# Altium footprint library HubProModel_v1.PcbLib: 67 footprints (part 5 of 5)
Each footprint in its own frame and in the unit in brackets; x right, y up, seen from the top. Pads: shape width x height; smd on the part's side, far side on the other; paste and mask are expansions set on the pad; w line width, h text height; cw(c..) or ccw(c..) is an arc to the next point about the centre after c.
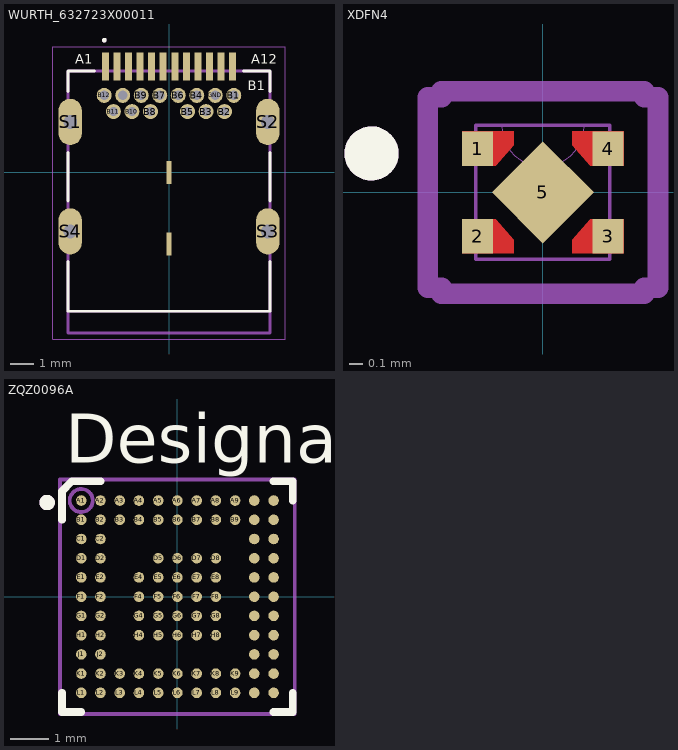
[diagram p4: the footprints below, top view; thin cyan lines are the x and y axes]

## WURTH_632723X00011 [mm] "USB-C (USB TYPE-C) USB 3.2 Gen 2 (USB 3.1 Gen 2, Superspeed + (USB 3.1)) Receptacle Connector 24 Position Surface Mount, Right Angle; Through Hole"
pads (32):
  rect 0.3x1.2 smd: A1(-2.75,4.58) A2(-2.25,4.58) A3(-1.75,4.58) A4(-1.25,4.58) A5(-0.75,4.58) A6(-0.25,4.58) A7(0.25,4.58) A8(0.75,4.58) A9(1.25,4.58) A10(1.75,4.58) A11(2.25,4.58) A12(2.75,4.58)
  round 0.65 hole 0.4: B1(2.8,3.33) B2(2.4,2.63) B3(1.6,2.63) B4(1.2,3.33) B5(0.8,2.63) B6(0.4,3.33) B7(-0.4,3.33) B8(-0.8,2.63) B9(-1.2,3.33) B10(-1.6,2.63) B11(-2.4,2.63) B12(-2.8,3.33) GND(2,3.33) GND1(-2,3.33)
  oval 1x2 hole 0.6 square: S1(-4.27,2.18) S2(4.27,2.18) S3(4.27,-2.55) S4(-4.27,-2.55)
  rect 0.2x1 smd: S5(0,0) S6(0,-3.1)
Top Overlay:
  circle w0.1: c-2.794,5.715 r0.05
  lines w0.127: -4.37,-3.854 -4.37,-6 4.37,-6 4.37,-3.854 ; -4.37,-1.236 -4.37,0.867 ; -4.37,3.494 -4.37,4.38 -3.213,4.38 ; 3.213,4.38 4.37,4.38 4.37,3.494 ; 4.37,-1.236 4.37,0.867
  text "A12" at 3.55,4.7 h0.41
  text "B1" at 3.4,3.55 h0.41
  text "A1" at -4.05,4.7 h0.41
Mechanical 13:
  lines w0.1: -2.748,5.735 ccw(c-2.794,5.715) -2.744,5.715
  lines w0.127: -4.37,-6 4.37,-6 ; -4.37,-6 -4.37,4.38 4.37,4.38 4.37,-6 ; -4.37,-6 -4.37,-6.95 4.37,-6.95 4.37,-6
  text "B1" at 3.4,3.55 h0.41
  text "A12" at 3.55,4.7 h0.41
  text "A1" at -4.05,4.7 h0.41
Mechanical 15:
  lines w0.05: -5.02,-7.2 -5.02,5.43 5.02,5.43 5.02,-7.2 -5.02,-7.2

## XDFN4 [mil] "Linear Voltage Regulator IC Positive Fixed 1 Output 450mA 4-XDFN (1x1)"
pads (5):
  rect 9x10 smd paste-5 mask-5: 1(-19,12.75) 2(-19,-12.75) 3(19,-12.75) 4(19,12.75)
  rect 21x21 smd rot 45 paste-10.5 mask+0: 5(0,0)
Top Layer:
  region: 0,10.5
  region: 0,-10.5
  region: 23.5,7.75 23.5,17.75 8.5,17.75 8.5,13.75 13.75,7.75
  region: -23.5,-7.75 -23.5,-17.75 -8.5,-17.75 -8.5,-13.75 -13.75,-7.75
  region: 23.5,-7.75 23.5,-17.75 8.5,-17.75 8.5,-13.75 13.75,-7.75
  region: -23.5,7.75 -23.5,17.75 -8.5,17.75 -8.5,13.75 -13.75,7.75
Top Overlay:
  circle w7.87: c-49.88,11.34 r3.94
Top Paste:
  region: -23.5,7.75 -23.5,17.75 -8.5,17.75 -8.5,13.75 -13.75,7.75
  region: 23.5,7.75 23.5,17.75 8.5,17.75 8.5,13.75 13.75,7.75
  region: -23.5,-7.75 -23.5,-17.75 -8.5,-17.75 -8.5,-13.75 -13.75,-7.75
  region: 23.5,-7.75 23.5,-17.75 8.5,-17.75 8.5,-13.75 13.75,-7.75
Top Solder:
  region: 0,10.5
  region: 0,-10.5
  region: -23.5,7.75 -23.5,17.75 -8.5,17.75 -8.5,13.75 -13.75,7.75
  region: 23.5,7.75 23.5,17.75 8.5,17.75 8.5,13.75 13.75,7.75
  region: -23.5,-7.75 -23.5,-17.75 -8.5,-17.75 -8.5,-13.75 -13.75,-7.75
  region: 23.5,-7.75 23.5,-17.75 8.5,-17.75 8.5,-13.75 13.75,-7.75
Mechanical 13:
  circle w7.87: c-49.88,11.34 r3.94
  lines w0: -12,19.5 ccw(c0,19.5) 12,19.5
  lines w1: -19.5,-19.5 19.5,-19.5 19.5,19.5 -19.5,19.5 -19.5,-19.5
Mechanical 15:
  lines w6: -33.5,-27.75 -33.5,27.75 -29.5,27.75 -29.5,29.5 29.5,29.5 29.5,27.75 33.5,27.75 33.5,-27.75 29.5,-27.75 29.5,-29.5 -29.5,-29.5 -29.5,-27.75 -33.5,-27.75

## ZQZ0096A [mm] "USB, Type-C Controller PMIC 96-BGA Microstar Junior (6x6)"
pads (96):
  round 0.275 smd paste+0 mask+0.051: A1(-2.5,2.5) A2(-2,2.5) A3(-1.5,2.5) A4(-1,2.5) A5(-0.5,2.5) A6(0,2.5) A7(0.5,2.5) A8(1,2.5) A9(1.5,2.5) A10(2,2.5) A11(2.5,2.5) B1(-2.5,2) B2(-2,2) B3(-1.5,2) B4(-1,2) B5(-0.5,2) B6(0,2) B7(0.5,2) B8(1,2) B9(1.5,2) B10(2,2) B11(2.5,2) C1(-2.5,1.5) C2(-2,1.5) C10(2,1.5) C11(2.5,1.5) D1(-2.5,1) D2(-2,1) D5(-0.5,1) D6(0,1) D7(0.5,1) D8(1,1) D10(2,1) D11(2.5,1) E1(-2.5,0.5) E2(-2,0.5) E4(-1,0.5) E5(-0.5,0.5) E6(0,0.5) E7(0.5,0.5) E8(1,0.5) E10(2,0.5) E11(2.5,0.5) F1(-2.5,0) F2(-2,0) F4(-1,0) F5(-0.5,0) F6(0,0) F7(0.5,0) F8(1,0) F10(2,0) F11(2.5,0) G1(-2.5,-0.5) G2(-2,-0.5) G4(-1,-0.5) G5(-0.5,-0.5) G6(0,-0.5) G7(0.5,-0.5) G8(1,-0.5) G10(2,-0.5) G11(2.5,-0.5) H1(-2.5,-1) H2(-2,-1) H4(-1,-1) H5(-0.5,-1) H6(0,-1) H7(0.5,-1) H8(1,-1) H10(2,-1) H11(2.5,-1) J1(-2.5,-1.5) J2(-2,-1.5) J10(2,-1.5) J11(2.5,-1.5) K1(-2.5,-2) K2(-2,-2) K3(-1.5,-2) K4(-1,-2) K5(-0.5,-2) K6(0,-2) K7(0.5,-2) K8(1,-2) K9(1.5,-2) K10(2,-2) K11(2.5,-2) L1(-2.5,-2.5) L2(-2,-2.5) L3(-1.5,-2.5) L4(-1,-2.5) L5(-0.5,-2.5) L6(0,-2.5) L7(0.5,-2.5) L8(1,-2.5) L9(1.5,-2.5) L10(2,-2.5) L11(2.5,-2.5)
Top Overlay:
  circle w0.2: c-3.388,2.448 r0.1
  lines w0.2: -3,-2.5 -3,-3 -2.5,-3 ; -3,2 -3,2.742 -2.742,3 -2,3 ; 2.5,-3 3,-3 3,-2.5 ; 2.5,3 3,3 3,2.5
  text "Designator9" at -2.921,3.48 h1.27
Mechanical 13:
  circle w0.1: c-2.5,2.5 r0.3
  circle w0.2: c-3.388,2.448 r0.1
  lines w0.1: -3.05,-3.05 -3.05,3.05 3.05,3.05 3.05,-3.05 -3.05,-3.05